# Altium schematic symbol library TI Power Management Shunt Voltage Reference.SchLib: 1526 symbols (part 6 of 18) (continued)
## LM4041DIDBZR
designator U?
Adjustable Precision Micropower Shunt Voltage Reference, 1.0% accuracy, 15 ppm / degC, 12 mA, -40 to 85 degC, 3-pin SOT-23 (DBZ), Green (RoHS & no Sb/Br); Manufacturer: Texas Instruments; PartNumber: LM4041DIDBZR; Initial Accuracy @ 25/deg C(%): 1; Iout/Iz(Max)(mA): 12; Min Iz for Regulation(uA): 65; Rating: Catalog; Temp Coeff(Max)(ppm/ degree C): 150; Temp Coeff(Typ)(ppm/ degree C): 15; VO Adj(Max)(V): 10; VO Adj(Min)(V): 1.225; DatasheetVersion: SLCS146E; PackageVersion: 4203227/B; PackageReference: DBZ3; PackageDescription: 3-Pin Plastic Small Outline, Body 2.92 x 1.3 mm, Pitch 0.95 mm; Supplier 1: Digi-Key; Supplier Part Number 1: 296-17946-2-ND; Supplier 2: Digi-Key; Supplier Part Number 2: 296-17946-1-ND; Supplier 3: Digi-Key; Supplier Part Number 3: 296-17946-6-ND; Supplier 4: Newark; Supplier Part Number 4: 31K7146; Supplier 5: Mouser; Supplier Part Number 5: 595-LM4041DIDBZR; Eco-Plan: Green (RoHS & no Sb/Br); SubFamily: Shunt Voltage Reference; Mounting Technology: Surface Mount; Code_JEDEC: TO-236; ComponentLink1Description: Manufacturer URL; ComponentLink1URL: http://www.ti.com/; ComponentLink2Description: Datasheet; ComponentLink2URL: http://www.ti.com/general/docs/lit/getliterature.tsp?genericPartNumber=LM4041D&fileType=pdf; ComponentLink3Description: Package Specification; ComponentLink3URL: http://www.ti.com/litv/pdf/mpds108a
footprint TI-DBZ3_N (SOT23, 3-Leads, Body 2.92x1.3 mm, Pitch 0.95 mm, IPC Medium Density)
pins: 1 FB (in), 2 CATHODE, 3 ANODE

## LM4041DIDBZRG4
designator U?
Adjustable Precision Micropower Shunt Voltage Reference, 1.0% accuracy, 15 ppm / degC, 12 mA, -40 to 85 degC, 3-pin SOT-23 (DBZ), Green (RoHS & no Sb/Br); Manufacturer: Texas Instruments; PartNumber: LM4041DIDBZRG4; Initial Accuracy @ 25/deg C(%): 1; Iout/Iz(Max)(mA): 12; Min Iz for Regulation(uA): 65; Rating: Catalog; Temp Coeff(Max)(ppm/ degree C): 150; Temp Coeff(Typ)(ppm/ degree C): 15; VO Adj(Max)(V): 10; VO Adj(Min)(V): 1.225; DatasheetVersion: SLCS146E; PackageVersion: 4203227/B; PackageReference: DBZ3; PackageDescription: 3-Pin Plastic Small Outline, Body 2.92 x 1.3 mm, Pitch 0.95 mm; Supplier 1: Digi-Key; Supplier Part Number 1: LM4041DIDBZRG4-ND; Supplier 2: Mouser; Supplier Part Number 2: 595-LM4041DIDBZRG4; Eco-Plan: Green (RoHS & no Sb/Br); SubFamily: Shunt Voltage Reference; Mounting Technology: Surface Mount; Code_JEDEC: TO-236; ComponentLink1Description: Manufacturer URL; ComponentLink1URL: http://www.ti.com/; ComponentLink2Description: Datasheet; ComponentLink2URL: http://www.ti.com/general/docs/lit/getliterature.tsp?genericPartNumber=LM4041D&fileType=pdf; ComponentLink3Description: Package Specification; ComponentLink3URL: http://www.ti.com/litv/pdf/mpds108a; ComponentLink4Description: URL Link1; ComponentLink4URL: Samples URL:http://www.ti.com/product/lm4041d
footprint TI-DBZ3_N (SOT23, 3-Leads, Body 2.92x1.3 mm, Pitch 0.95 mm, IPC Medium Density)
pins: 1 FB (in), 2 CATHODE, 3 ANODE

## LM4041DIDBZT
designator U?
Adjustable Precision Micropower Shunt Voltage Reference, 1.0% accuracy, 1.225 V, 15 ppm / degC, 12 mA, -40 to 85 degC, 3-pin SOT-23 (DBZ), Green (RoHS & no Sb/Br); Manufacturer: Texas Instruments; PartNumber: LM4041DIDBZT; Initial Accuracy @ 25/deg C(%): 1; Iout/Iz(Max)(mA): 12; Min Iz for Regulation(uA): 65; Rating: Catalog; Temp Coeff(Max)(ppm/ degree C): 150; Temp Coeff(Typ)(ppm/ degree C): 15; VO Adj(Max)(V): 10; VO Adj(Min)(V): 1.225; DatasheetVersion: SLCS146E; PackageVersion: 4203227/B; PackageReference: DBZ3; PackageDescription: 3-Pin Plastic Small Outline, Body 2.92 x 1.3 mm, Pitch 0.95 mm; Supplier 1: Digi-Key; Supplier Part Number 1: 296-32132-2-ND; Supplier 2: Digi-Key; Supplier Part Number 2: 296-32132-1-ND; Supplier 3: Digi-Key; Supplier Part Number 3: 296-32132-6-ND; Supplier 4: Mouser; Supplier Part Number 4: 595-LM4041DIDBZT; Eco-Plan: Green (RoHS & no Sb/Br); SubFamily: Shunt Voltage Reference; VO(V): 1.225; Mounting Technology: Surface Mount; Code_JEDEC: TO-236; ComponentLink1Description: Manufacturer URL; ComponentLink1URL: http://www.ti.com/; ComponentLink2Description: Datasheet; ComponentLink2URL: http://www.ti.com/general/docs/lit/getliterature.tsp?genericPartNumber=LM4041D&fileType=pdf; ComponentLink3Description: Package Specification; ComponentLink3URL: http://www.ti.com/litv/pdf/mpds108a
footprint TI-DBZ3_N (SOT23, 3-Leads, Body 2.92x1.3 mm, Pitch 0.95 mm, IPC Medium Density)
pins: 1 FB (in), 2 CATHODE, 3 ANODE

## LM4041DIDBZTG4
designator U?
Adjustable Precision Micropower Shunt Voltage Reference, 1.0% accuracy, 1.225 V, 15 ppm / degC, 12 mA, -40 to 85 degC, 3-pin SOT-23 (DBZ), Green (RoHS & no Sb/Br); Manufacturer: Texas Instruments; PartNumber: LM4041DIDBZTG4; Initial Accuracy @ 25/deg C(%): 1; Iout/Iz(Max)(mA): 12; Min Iz for Regulation(uA): 65; Rating: Catalog; Temp Coeff(Max)(ppm/ degree C): 150; Temp Coeff(Typ)(ppm/ degree C): 15; VO Adj(Max)(V): 10; VO Adj(Min)(V): 1.225; DatasheetVersion: SLCS146E; PackageVersion: 4203227/B; PackageReference: DBZ3; PackageDescription: 3-Pin Plastic Small Outline, Body 2.92 x 1.3 mm, Pitch 0.95 mm; Supplier 1: Digi-Key; Supplier Part Number 1: LM4041DIDBZTG4-ND; Supplier 2: Farnell; Supplier Part Number 2: 1053788; Supplier 3: Newark; Supplier Part Number 3: 97K3503; Supplier 4: Mouser; Supplier Part Number 4: 595-LM4041DIDBZTG4; Eco-Plan: Green (RoHS & no Sb/Br); SubFamily: Shunt Voltage Reference; VO(V): 1.225; Mounting Technology: Surface Mount; Code_JEDEC: TO-236; ComponentLink1Description: Manufacturer URL; ComponentLink1URL: http://www.ti.com/; ComponentLink2Description: Datasheet; ComponentLink2URL: http://www.ti.com/general/docs/lit/getliterature.tsp?genericPartNumber=LM4041D&fileType=pdf; ComponentLink3Description: Package Specification; ComponentLink3URL: http://www.ti.com/litv/pdf/mpds108a
footprint TI-DBZ3_N (SOT23, 3-Leads, Body 2.92x1.3 mm, Pitch 0.95 mm, IPC Medium Density)
pins: 1 FB (in), 2 CATHODE, 3 ANODE

## LM4041DIDCKR
designator U?
Adjustable Precision Micropower Shunt Voltage Reference, 1.0% accuracy, 15 ppm / degC, 12 mA, -40 to 85 degC, 5-pin SC70 (DCK), Green (RoHS & no Sb/Br); Manufacturer: Texas Instruments; PartNumber: LM4041DIDCKR; Initial Accuracy @ 25/deg C(%): 1; Iout/Iz(Max)(mA): 12; Min Iz for Regulation(uA): 65; Rating: Catalog; Temp Coeff(Max)(ppm/ degree C): 150; Temp Coeff(Typ)(ppm/ degree C): 15; VO Adj(Max)(V): 10; VO Adj(Min)(V): 1.225; DatasheetVersion: SLCS146E; PackageReference: DCK5; PackageDescription: 5-Pin Plastic Small-Outline Package, 2 x 1.3 mm Body, 0.65 mm Pitch, 2.1 mm Lead Span; Supplier 1: Digi-Key; Supplier Part Number 1: 296-17947-2-ND; Supplier 2: Digi-Key; Supplier Part Number 2: 296-17947-1-ND; Supplier 3: Digi-Key; Supplier Part Number 3: 296-17947-6-ND; Supplier 4: Newark; Supplier Part Number 4: 31K7150; Supplier 5: Mouser; Supplier Part Number 5: 595-LM4041DIDCKR; Eco-Plan: Green (RoHS & no Sb/Br); SubFamily: Shunt Voltage Reference; Mounting Technology: Surface Mount; Code_JEDEC: MO-203; ComponentLink1Description: Manufacturer URL; ComponentLink1URL: http://www.ti.com/; ComponentLink2Description: Datasheet; ComponentLink2URL: http://www.ti.com/general/docs/lit/getliterature.tsp?genericPartNumber=LM4041D&fileType=pdf; ComponentLink3Description: Package Specification; ComponentLink3URL: http://www.ti.com/litv/pdf/mpds025f; ComponentLink4Description: URL Link1; ComponentLink4URL: Samples URL:http://www.ti.com/product/lm4041d
footprint TI-DCK5_N (SOT353, 5-Leads, Body 2x1.3mm, Pitch 0.65mm, Lead Span 2.1mm, IPC Medium Density)
part A pins: 2 ANODE, 3 CATHODE, 5 FB (in)
part B pins: 1 NC "No internal connection.", 4 NC "No internal connection."

## LM4041DIDCKRE4
designator U?
Adjustable Precision Micropower Shunt Voltage Reference, 1.0% accuracy, 15 ppm / degC, 12 mA, -40 to 85 degC, 5-pin SC70 (DCK), Green (RoHS & no Sb/Br); Manufacturer: Texas Instruments; PartNumber: LM4041DIDCKRE4; Initial Accuracy @ 25/deg C(%): 1; Iout/Iz(Max)(mA): 12; Min Iz for Regulation(uA): 65; Rating: Catalog; Temp Coeff(Max)(ppm/ degree C): 150; Temp Coeff(Typ)(ppm/ degree C): 15; VO Adj(Max)(V): 10; VO Adj(Min)(V): 1.225; DatasheetVersion: SLCS146E; PackageReference: DCK5; PackageDescription: 5-Pin Plastic Small-Outline Package, 2 x 1.3 mm Body, 0.65 mm Pitch, 2.1 mm Lead Span; Supplier 1: Digi-Key; Supplier Part Number 1: LM4041DIDCKRE4-ND; Supplier 2: Newark; Supplier Part Number 2: 37K0375; Supplier 3: Mouser; Supplier Part Number 3: 595-LM4041DIDCKRE4; Eco-Plan: Green (RoHS & no Sb/Br); SubFamily: Shunt Voltage Reference; Mounting Technology: Surface Mount; Code_JEDEC: MO-203; ComponentLink1Description: Manufacturer URL; ComponentLink1URL: http://www.ti.com/; ComponentLink2Description: Datasheet; ComponentLink2URL: http://www.ti.com/general/docs/lit/getliterature.tsp?genericPartNumber=LM4041D&fileType=pdf; ComponentLink3Description: Package Specification; ComponentLink3URL: http://www.ti.com/litv/pdf/mpds025f; ComponentLink4Description: URL Link1; ComponentLink4URL: Samples URL:http://www.ti.com/product/lm4041d
footprint TI-DCK5_N (SOT353, 5-Leads, Body 2x1.3mm, Pitch 0.65mm, Lead Span 2.1mm, IPC Medium Density)
part A pins: 2 ANODE, 3 CATHODE, 5 FB (in)
part B pins: 1 NC "No internal connection.", 4 NC "No internal connection."

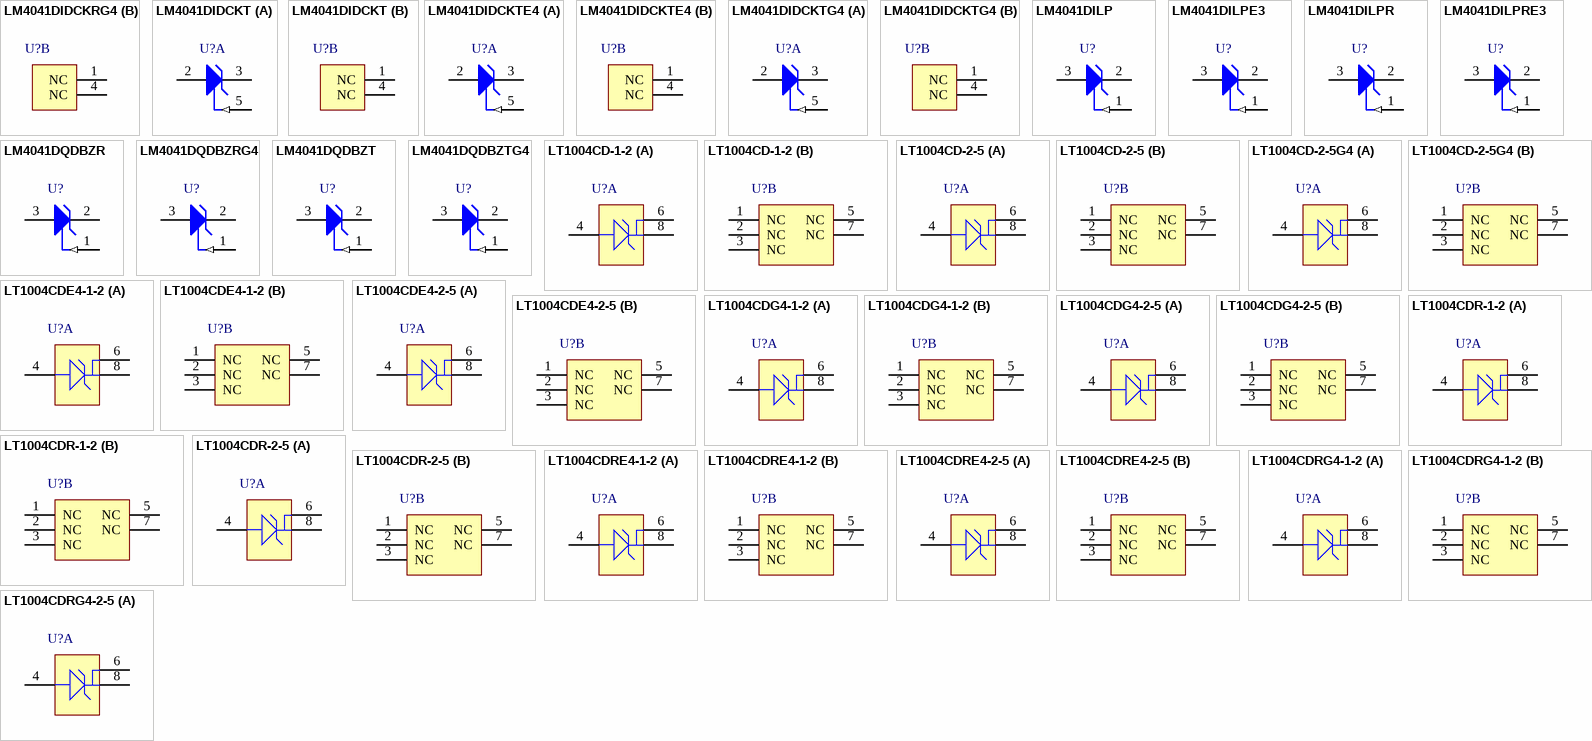
[diagram p17: symbols LM4041DIDCKRG4 to LT1004CDRG4-2-5]

## LM4041DIDCKRG4
designator U?
Adjustable Precision Micropower Shunt Voltage Reference, 1.0% accuracy, 15 ppm / degC, 12 mA, -40 to 85 degC, 5-pin SC70 (DCK), Green (RoHS & no Sb/Br); Manufacturer: Texas Instruments; PartNumber: LM4041DIDCKRG4; Initial Accuracy @ 25/deg C(%): 1; Iout/Iz(Max)(mA): 12; Min Iz for Regulation(uA): 65; Rating: Catalog; Temp Coeff(Max)(ppm/ degree C): 150; Temp Coeff(Typ)(ppm/ degree C): 15; VO Adj(Max)(V): 10; VO Adj(Min)(V): 1.225; DatasheetVersion: SLCS146E; PackageReference: DCK5; PackageDescription: 5-Pin Plastic Small-Outline Package, 2 x 1.3 mm Body, 0.65 mm Pitch, 2.1 mm Lead Span; Supplier 1: Digi-Key; Supplier Part Number 1: LM4041DIDCKRG4-ND; Supplier 2: Mouser; Supplier Part Number 2: 595-LM4041DIDCKRG4; Eco-Plan: Green (RoHS & no Sb/Br); SubFamily: Shunt Voltage Reference; Mounting Technology: Surface Mount; Code_JEDEC: MO-203; ComponentLink1Description: Manufacturer URL; ComponentLink1URL: http://www.ti.com/; ComponentLink2Description: Datasheet; ComponentLink2URL: http://www.ti.com/general/docs/lit/getliterature.tsp?genericPartNumber=LM4041D&fileType=pdf; ComponentLink3Description: Package Specification; ComponentLink3URL: http://www.ti.com/litv/pdf/mpds025f; ComponentLink4Description: URL Link1; ComponentLink4URL: Samples URL:http://www.ti.com/product/lm4041d
footprint TI-DCK5_N (SOT353, 5-Leads, Body 2x1.3mm, Pitch 0.65mm, Lead Span 2.1mm, IPC Medium Density)
part A pins: 2 ANODE, 3 CATHODE, 5 FB (in)
part B pins: 1 NC "No internal connection.", 4 NC "No internal connection."

## LM4041DIDCKT
designator U?
Adjustable Precision Micropower Shunt Voltage Reference, 1.0% accuracy, 15 ppm / degC, 12 mA, -40 to 85 degC, 5-pin SC70 (DCK), Green (RoHS & no Sb/Br); Manufacturer: Texas Instruments; PartNumber: LM4041DIDCKT; Initial Accuracy @ 25/deg C(%): 1; Iout/Iz(Max)(mA): 12; Min Iz for Regulation(uA): 65; Rating: Catalog; Temp Coeff(Max)(ppm/ degree C): 150; Temp Coeff(Typ)(ppm/ degree C): 15; VO Adj(Max)(V): 10; VO Adj(Min)(V): 1.225; DatasheetVersion: SLCS146E; PackageReference: DCK5; PackageDescription: 5-Pin Plastic Small-Outline Package, 2 x 1.3 mm Body, 0.65 mm Pitch, 2.1 mm Lead Span; Supplier 1: Digi-Key; Supplier Part Number 1: 296-32133-2-ND; Supplier 2: Digi-Key; Supplier Part Number 2: 296-32133-1-ND; Supplier 3: Digi-Key; Supplier Part Number 3: 296-32133-6-ND; Supplier 4: Mouser; Supplier Part Number 4: 595-LM4041DIDCKT; Eco-Plan: Green (RoHS & no Sb/Br); SubFamily: Shunt Voltage Reference; Mounting Technology: Surface Mount; Code_JEDEC: MO-203; ComponentLink1Description: Manufacturer URL; ComponentLink1URL: http://www.ti.com/; ComponentLink2Description: Datasheet; ComponentLink2URL: http://www.ti.com/general/docs/lit/getliterature.tsp?genericPartNumber=LM4041D&fileType=pdf; ComponentLink3Description: Package Specification; ComponentLink3URL: http://www.ti.com/litv/pdf/mpds025f
footprint TI-DCK5_N (SOT353, 5-Leads, Body 2x1.3mm, Pitch 0.65mm, Lead Span 2.1mm, IPC Medium Density)
part A pins: 2 ANODE, 3 CATHODE, 5 FB (in)
part B pins: 1 NC "No internal connection.", 4 NC "No internal connection."

## LM4041DIDCKTE4
designator U?
Adjustable Precision Micropower Shunt Voltage Reference, 1.0% accuracy, 15 ppm / degC, 12 mA, -40 to 85 degC, 5-pin SC70 (DCK), Green (RoHS & no Sb/Br); Manufacturer: Texas Instruments; PartNumber: LM4041DIDCKTE4; Initial Accuracy @ 25/deg C(%): 1; Iout/Iz(Max)(mA): 12; Min Iz for Regulation(uA): 65; Rating: Catalog; Temp Coeff(Max)(ppm/ degree C): 150; Temp Coeff(Typ)(ppm/ degree C): 15; VO Adj(Max)(V): 10; VO Adj(Min)(V): 1.225; DatasheetVersion: SLCS146E; PackageReference: DCK5; PackageDescription: 5-Pin Plastic Small-Outline Package, 2 x 1.3 mm Body, 0.65 mm Pitch, 2.1 mm Lead Span; Supplier 1: Digi-Key; Supplier Part Number 1: LM4041DIDCKTE4-ND; Supplier 2: Farnell; Supplier Part Number 2: 1053783; Supplier 3: Newark; Supplier Part Number 3: 37K0376; Supplier 4: Mouser; Supplier Part Number 4: 595-LM4041DIDCKTE4; Eco-Plan: Green (RoHS & no Sb/Br); SubFamily: Shunt Voltage Reference; Mounting Technology: Surface Mount; Code_JEDEC: MO-203; ComponentLink1Description: Manufacturer URL; ComponentLink1URL: http://www.ti.com/; ComponentLink2Description: Datasheet; ComponentLink2URL: http://www.ti.com/general/docs/lit/getliterature.tsp?genericPartNumber=LM4041D&fileType=pdf; ComponentLink3Description: Package Specification; ComponentLink3URL: http://www.ti.com/litv/pdf/mpds025f; ComponentLink4Description: URL Link1; ComponentLink4URL: Samples URL:http://www.ti.com/product/lm4041d
footprint TI-DCK5_N (SOT353, 5-Leads, Body 2x1.3mm, Pitch 0.65mm, Lead Span 2.1mm, IPC Medium Density)
part A pins: 2 ANODE, 3 CATHODE, 5 FB (in)
part B pins: 1 NC "No internal connection.", 4 NC "No internal connection."

## LM4041DIDCKTG4
designator U?
Adjustable Precision Micropower Shunt Voltage Reference, 1.0% accuracy, 15 ppm / degC, 12 mA, -40 to 85 degC, 5-pin SC70 (DCK), Green (RoHS & no Sb/Br); Manufacturer: Texas Instruments; PartNumber: LM4041DIDCKTG4; Initial Accuracy @ 25/deg C(%): 1; Iout/Iz(Max)(mA): 12; Min Iz for Regulation(uA): 65; Rating: Catalog; Temp Coeff(Max)(ppm/ degree C): 150; Temp Coeff(Typ)(ppm/ degree C): 15; VO Adj(Max)(V): 10; VO Adj(Min)(V): 1.225; DatasheetVersion: SLCS146E; PackageReference: DCK5; PackageDescription: 5-Pin Plastic Small-Outline Package, 2 x 1.3 mm Body, 0.65 mm Pitch, 2.1 mm Lead Span; Supplier 1: Digi-Key; Supplier Part Number 1: LM4041DIDCKTG4-ND; Supplier 2: Mouser; Supplier Part Number 2: 595-LM4041DIDCKTG4; Eco-Plan: Green (RoHS & no Sb/Br); SubFamily: Shunt Voltage Reference; Mounting Technology: Surface Mount; Code_JEDEC: MO-203; ComponentLink1Description: Manufacturer URL; ComponentLink1URL: http://www.ti.com/; ComponentLink2Description: Datasheet; ComponentLink2URL: http://www.ti.com/general/docs/lit/getliterature.tsp?genericPartNumber=LM4041D&fileType=pdf; ComponentLink3Description: Package Specification; ComponentLink3URL: http://www.ti.com/litv/pdf/mpds025f; ComponentLink4Description: URL Link1; ComponentLink4URL: Samples URL:http://www.ti.com/product/lm4041d
footprint TI-DCK5_N (SOT353, 5-Leads, Body 2x1.3mm, Pitch 0.65mm, Lead Span 2.1mm, IPC Medium Density)
part A pins: 2 ANODE, 3 CATHODE, 5 FB (in)
part B pins: 1 NC "No internal connection.", 4 NC "No internal connection."

## LM4041DILP
designator U?
Adjustable Precision Micropower Shunt Voltage Reference, 1.0% accuracy, 15 ppm / degC, 12 mA, -40 to 85 degC, 3-pin TO-92 (LP), Pb-Free (RoHS); Manufacturer: Texas Instruments; PartNumber: LM4041DILP; Initial Accuracy @ 25/deg C(%): 1; Iout/Iz(Max)(mA): 12; Min Iz for Regulation(uA): 65; Rating: Catalog; Temp Coeff(Max)(ppm/ degree C): 150; Temp Coeff(Typ)(ppm/ degree C): 15; VO Adj(Max)(V): 10; VO Adj(Min)(V): 1.225; DatasheetVersion: SLCS146E; PackageVersion: 4040001-2/C; PackageReference: LP3; PackageDescription: Plastic Cylindrical Package, Formed Lead Option (TO-92); Supplier 1: Digi-Key; Supplier Part Number 1: LM4041DILP-ND; Supplier 2: Newark; Supplier Part Number 2: 50M8858; Supplier 3: Mouser; Supplier Part Number 3: 595-LM4041DILP; Eco-Plan: Pb-Free (RoHS); SubFamily: Shunt Voltage Reference; Mounting Technology: Through Hole; Code_JEDEC: TO-226; ComponentLink1Description: Manufacturer URL; ComponentLink1URL: http://www.ti.com/; ComponentLink2Description: Datasheet; ComponentLink2URL: http://www.ti.com/general/docs/lit/getliterature.tsp?genericPartNumber=LM4041D&fileType=pdf; ComponentLink3Description: Package Specification; ComponentLink3URL: http://www.ti.com/litv/pdf/msot002a; ComponentLink4Description: URL Link1; ComponentLink4URL: Samples URL:http://www.ti.com/product/lm4041d
footprint TI-LP3 (TO, Flat Index; 3 In-Line, Formed Axial Leads; Body Dia. 4.8mm; Leads 0.56 x 0.41 mm (max))
pins: 1 FB (in), 2 CATHODE, 3 ANODE

## LM4041DILPE3
designator U?
Adjustable Precision Micropower Shunt Voltage Reference, 1.0% accuracy, 15 ppm / degC, 12 mA, -40 to 85 degC, 3-pin TO-92 (LP), Pb-Free (RoHS); Manufacturer: Texas Instruments; PartNumber: LM4041DILPE3; Initial Accuracy @ 25/deg C(%): 1; Iout/Iz(Max)(mA): 12; Min Iz for Regulation(uA): 65; Rating: Catalog; Temp Coeff(Max)(ppm/ degree C): 150; Temp Coeff(Typ)(ppm/ degree C): 15; VO Adj(Max)(V): 10; VO Adj(Min)(V): 1.225; DatasheetVersion: SLCS146E; PackageVersion: 4040001-2/C; PackageReference: LP3; PackageDescription: Plastic Cylindrical Package, Formed Lead Option (TO-92); Supplier 1: Digi-Key; Supplier Part Number 1: LM4041DILPE3-ND; Supplier 2: Newark; Supplier Part Number 2: 65M1450; Supplier 3: Mouser; Supplier Part Number 3: 595-LM4041DILPE3; Eco-Plan: Pb-Free (RoHS); SubFamily: Shunt Voltage Reference; Mounting Technology: Through Hole; Code_JEDEC: TO-226; ComponentLink1Description: Manufacturer URL; ComponentLink1URL: http://www.ti.com/; ComponentLink2Description: Datasheet; ComponentLink2URL: http://www.ti.com/general/docs/lit/getliterature.tsp?genericPartNumber=LM4041D&fileType=pdf; ComponentLink3Description: Package Specification; ComponentLink3URL: http://www.ti.com/litv/pdf/msot002a
footprint TI-LP3 (TO, Flat Index; 3 In-Line, Formed Axial Leads; Body Dia. 4.8mm; Leads 0.56 x 0.41 mm (max))
pins: 1 FB (in), 2 CATHODE, 3 ANODE

## LM4041DILPR
designator U?
Adjustable Precision Micropower Shunt Voltage Reference, 1.0% accuracy, 15 ppm / degC, 12 mA, -40 to 85 degC, 3-pin TO-92 (LP), Pb-Free (RoHS); Manufacturer: Texas Instruments; PartNumber: LM4041DILPR; Initial Accuracy @ 25/deg C(%): 1; Iout/Iz(Max)(mA): 12; Min Iz for Regulation(uA): 65; Rating: Catalog; Temp Coeff(Max)(ppm/ degree C): 150; Temp Coeff(Typ)(ppm/ degree C): 15; VO Adj(Max)(V): 10; VO Adj(Min)(V): 1.225; DatasheetVersion: SLCS146E; PackageVersion: 4040001-2/C; PackageReference: LP3; PackageDescription: Plastic Cylindrical Package, Formed Lead Option (TO-92); Supplier 1: Digi-Key; Supplier Part Number 1: 296-22176-3-ND; Supplier 2: Digi-Key; Supplier Part Number 2: 296-22176-1-ND; Supplier 3: Newark; Supplier Part Number 3: 50M8859; Supplier 4: Mouser; Supplier Part Number 4: 595-LM4041DILPR; Eco-Plan: Pb-Free (RoHS); SubFamily: Shunt Voltage Reference; Mounting Technology: Through Hole; Code_JEDEC: TO-226; ComponentLink1Description: Manufacturer URL; ComponentLink1URL: http://www.ti.com/; ComponentLink2Description: Datasheet; ComponentLink2URL: http://www.ti.com/general/docs/lit/getliterature.tsp?genericPartNumber=LM4041D&fileType=pdf; ComponentLink3Description: Package Specification; ComponentLink3URL: http://www.ti.com/litv/pdf/msot002a
footprint TI-LP3 (TO, Flat Index; 3 In-Line, Formed Axial Leads; Body Dia. 4.8mm; Leads 0.56 x 0.41 mm (max))
pins: 1 FB (in), 2 CATHODE, 3 ANODE

## LM4041DILPRE3
designator U?
Adjustable Precision Micropower Shunt Voltage Reference, 1.0% accuracy, 15 ppm / degC, 12 mA, -40 to 85 degC, 3-pin TO-92 (LP), Pb-Free (RoHS); Manufacturer: Texas Instruments; PartNumber: LM4041DILPRE3; Initial Accuracy @ 25/deg C(%): 1; Iout/Iz(Max)(mA): 12; Min Iz for Regulation(uA): 65; Rating: Catalog; Temp Coeff(Max)(ppm/ degree C): 150; Temp Coeff(Typ)(ppm/ degree C): 15; VO Adj(Max)(V): 10; VO Adj(Min)(V): 1.225; DatasheetVersion: SLCS146E; PackageVersion: 4040001-2/C; PackageReference: LP3; PackageDescription: Plastic Cylindrical Package, Formed Lead Option (TO-92); Supplier 1: Digi-Key; Supplier Part Number 1: LM4041DILPRE3-ND; Supplier 2: Mouser; Supplier Part Number 2: 595-LM4041DILPRE3; Eco-Plan: Pb-Free (RoHS); SubFamily: Shunt Voltage Reference; Mounting Technology: Through Hole; Code_JEDEC: TO-226; ComponentLink1Description: Manufacturer URL; ComponentLink1URL: http://www.ti.com/; ComponentLink2Description: Datasheet; ComponentLink2URL: http://www.ti.com/general/docs/lit/getliterature.tsp?genericPartNumber=LM4041D&fileType=pdf; ComponentLink3Description: Package Specification; ComponentLink3URL: http://www.ti.com/litv/pdf/msot002a
footprint TI-LP3 (TO, Flat Index; 3 In-Line, Formed Axial Leads; Body Dia. 4.8mm; Leads 0.56 x 0.41 mm (max))
pins: 1 FB (in), 2 CATHODE, 3 ANODE

## LM4041DQDBZR
designator U?
Adjustable Precision Micropower Shunt Voltage Reference, 1.0% accuracy, 15 ppm / degC, 12 mA, -40 to 125 degC, 3-pin SOT-23 (DBZ), Green (RoHS & no Sb/Br); Manufacturer: Texas Instruments; PartNumber: LM4041DQDBZR; Initial Accuracy @ 25/deg C(%): 1; Iout/Iz(Max)(mA): 12; Min Iz for Regulation(uA): 65; Rating: Catalog; Temp Coeff(Max)(ppm/ degree C): 150; Temp Coeff(Typ)(ppm/ degree C): 15; VO Adj(Max)(V): 10; VO Adj(Min)(V): 1.225; DatasheetVersion: SLCS146E; PackageVersion: 4203227/B; PackageReference: DBZ3; PackageDescription: 3-Pin Plastic Small Outline, Body 2.92 x 1.3 mm, Pitch 0.95 mm; Supplier 1: Digi-Key; Supplier Part Number 1: 296-17948-2-ND; Supplier 2: Digi-Key; Supplier Part Number 2: 296-17948-1-ND; Supplier 3: Digi-Key; Supplier Part Number 3: 296-17948-6-ND; Supplier 4: Mouser; Supplier Part Number 4: 595-LM4041DQDBZR; Eco-Plan: Green (RoHS & no Sb/Br); SubFamily: Shunt Voltage Reference; Mounting Technology: Surface Mount; Code_JEDEC: TO-236; ComponentLink1Description: Manufacturer URL; ComponentLink1URL: http://www.ti.com/; ComponentLink2Description: Datasheet; ComponentLink2URL: http://www.ti.com/general/docs/lit/getliterature.tsp?genericPartNumber=LM4041D&fileType=pdf; ComponentLink3Description: Package Specification; ComponentLink3URL: http://www.ti.com/litv/pdf/mpds108a; ComponentLink4Description: URL Link1; ComponentLink4URL: Samples URL:http://www.ti.com/product/lm4041d
footprint TI-DBZ3_N (SOT23, 3-Leads, Body 2.92x1.3 mm, Pitch 0.95 mm, IPC Medium Density)
pins: 1 FB (in), 2 CATHODE, 3 ANODE

## LM4041DQDBZRG4
designator U?
Adjustable Precision Micropower Shunt Voltage Reference, 1.0% accuracy, 15 ppm / degC, 12 mA, -40 to 125 degC, 3-pin SOT-23 (DBZ), Green (RoHS & no Sb/Br); Manufacturer: Texas Instruments; PartNumber: LM4041DQDBZRG4; Initial Accuracy @ 25/deg C(%): 1; Iout/Iz(Max)(mA): 12; Min Iz for Regulation(uA): 65; Rating: Catalog; Temp Coeff(Max)(ppm/ degree C): 150; Temp Coeff(Typ)(ppm/ degree C): 15; VO Adj(Max)(V): 10; VO Adj(Min)(V): 1.225; DatasheetVersion: SLCS146E; PackageVersion: 4203227/B; PackageReference: DBZ3; PackageDescription: 3-Pin Plastic Small Outline, Body 2.92 x 1.3 mm, Pitch 0.95 mm; Supplier 1: Digi-Key; Supplier Part Number 1: LM4041DQDBZRG4-ND; Supplier 2: Newark; Supplier Part Number 2: 31K7153; Supplier 3: Mouser; Supplier Part Number 3: 595-LM4041DQDBZRG4; Eco-Plan: Green (RoHS & no Sb/Br); SubFamily: Shunt Voltage Reference; Mounting Technology: Surface Mount; Code_JEDEC: TO-236; ComponentLink1Description: Manufacturer URL; ComponentLink1URL: http://www.ti.com/; ComponentLink2Description: Datasheet; ComponentLink2URL: http://www.ti.com/general/docs/lit/getliterature.tsp?genericPartNumber=LM4041D&fileType=pdf; ComponentLink3Description: Package Specification; ComponentLink3URL: http://www.ti.com/litv/pdf/mpds108a; ComponentLink4Description: URL Link1; ComponentLink4URL: Samples URL:http://www.ti.com/product/lm4041d
footprint TI-DBZ3_N (SOT23, 3-Leads, Body 2.92x1.3 mm, Pitch 0.95 mm, IPC Medium Density)
pins: 1 FB (in), 2 CATHODE, 3 ANODE

## LM4041DQDBZT
designator U?
Adjustable Precision Micropower Shunt Voltage Reference,1.0% accuracy, 15 ppm / degC, 12 mA, -40 to 125 degC, 3-pin SOT-23 (DBZ), Green (RoHS & no Sb/Br); Manufacturer: Texas Instruments; PartNumber: LM4041DQDBZT; Initial Accuracy @ 25/deg C(%): 1; Iout/Iz(Max)(mA): 12; Min Iz for Regulation(uA): 65; Rating: Catalog; Temp Coeff(Max)(ppm/ degree C): 150; Temp Coeff(Typ)(ppm/ degree C): 15; VO Adj(Max)(V): 10; VO Adj(Min)(V): 1.225; DatasheetVersion: SLCS146E; PackageVersion: 4203227/B; PackageReference: DBZ3; PackageDescription: 3-Pin Plastic Small Outline, Body 2.92 x 1.3 mm, Pitch 0.95 mm; Supplier 1: Digi-Key; Supplier Part Number 1: 296-32134-2-ND; Supplier 2: Digi-Key; Supplier Part Number 2: 296-32134-1-ND; Supplier 3: Digi-Key; Supplier Part Number 3: 296-32134-6-ND; Supplier 4: Farnell; Supplier Part Number 4: 1053780; Supplier 5: Mouser; Supplier Part Number 5: 595-LM4041DQDBZT; Eco-Plan: Green (RoHS & no Sb/Br); SubFamily: Shunt Voltage Reference; Mounting Technology: Surface Mount; Code_JEDEC: TO-236; ComponentLink1Description: Manufacturer URL; ComponentLink1URL: http://www.ti.com/; ComponentLink2Description: Datasheet; ComponentLink2URL: http://www.ti.com/general/docs/lit/getliterature.tsp?genericPartNumber=LM4041D&fileType=pdf; ComponentLink3Description: Package Specification; ComponentLink3URL: http://www.ti.com/litv/pdf/mpds108a; ComponentLink4Description: URL Link1; ComponentLink4URL: Samples URL:http://www.ti.com/product/lm4041d
footprint TI-DBZ3_N (SOT23, 3-Leads, Body 2.92x1.3 mm, Pitch 0.95 mm, IPC Medium Density)
pins: 1 FB (in), 2 CATHODE, 3 ANODE

## LM4041DQDBZTG4
designator U?
Adjustable Precision Micropower Shunt Voltage Reference,1.0% accuracy, 15 ppm / degC, 12 mA, -40 to 125 degC, 3-pin SOT-23 (DBZ), Green (RoHS & no Sb/Br); Manufacturer: Texas Instruments; PartNumber: LM4041DQDBZTG4; Initial Accuracy @ 25/deg C(%): 1; Iout/Iz(Max)(mA): 12; Min Iz for Regulation(uA): 65; Rating: Catalog; Temp Coeff(Max)(ppm/ degree C): 150; Temp Coeff(Typ)(ppm/ degree C): 15; VO Adj(Max)(V): 10; VO Adj(Min)(V): 1.225; DatasheetVersion: SLCS146E; PackageVersion: 4203227/B; PackageReference: DBZ3; PackageDescription: 3-Pin Plastic Small Outline, Body 2.92 x 1.3 mm, Pitch 0.95 mm; Supplier 1: Digi-Key; Supplier Part Number 1: LM4041DQDBZTG4-ND; Supplier 2: Farnell; Supplier Part Number 2: 1053779; Supplier 3: Newark; Supplier Part Number 3: 97K3509; Supplier 4: Mouser; Supplier Part Number 4: 595-LM4041DQDBZTG4; Eco-Plan: Green (RoHS & no Sb/Br); SubFamily: Shunt Voltage Reference; Mounting Technology: Surface Mount; Code_JEDEC: TO-236; ComponentLink1Description: Manufacturer URL; ComponentLink1URL: http://www.ti.com/; ComponentLink2Description: Datasheet; ComponentLink2URL: http://www.ti.com/general/docs/lit/getliterature.tsp?genericPartNumber=LM4041D&fileType=pdf; ComponentLink3Description: Package Specification; ComponentLink3URL: http://www.ti.com/litv/pdf/mpds108a; ComponentLink4Description: URL Link1; ComponentLink4URL: Samples URL:http://www.ti.com/product/lm4041d
footprint TI-DBZ3_N (SOT23, 3-Leads, Body 2.92x1.3 mm, Pitch 0.95 mm, IPC Medium Density)
pins: 1 FB (in), 2 CATHODE, 3 ANODE

## LT1004CD-1-2
designator U?
Micropower Integrated Precision Voltage Reference, 1.235 V, 20 ppm / degC, 20 mA, 0 to 70 degC, 8-pin SOIC (D), Green (RoHS & no Sb/Br); Manufacturer: Texas Instruments; PartNumber: LT1004CD-1-2; Initial Accuracy @ 25/deg C(%): 1; Iout/Iz(Max)(mA): 20; Min Iz for Regulation(uA): 10; Rating: Catalog; SubFamily: Shunt Voltage Reference; VO(V): 1.235; DatasheetVersion: SLVS022M; PackageVersion: 4040047-3/M; PackageReference: D8; PackageDescription: 8-Pin Plastic Small Outline, Body 4.9 x 3.9 mm, Pitch 1.27 mm; Supplier 1: Digi-Key; Supplier Part Number 1: 296-9580-5-ND; Supplier 2: Newark; Supplier Part Number 2: 75C0910; Supplier 3: Mouser; Supplier Part Number 3: 595-LT1004CD-1-2; Eco-Plan: Green (RoHS & no Sb/Br); Temp Coeff(Typ)(ppm/ degree C): 20; Mounting Technology: Surface Mount; Code_JEDEC: MS-012; ComponentLink1Description: Manufacturer URL; ComponentLink1URL: http://www.ti.com/; ComponentLink2Description: Datasheet; ComponentLink2URL: http://www.ti.com/general/docs/lit/getliterature.tsp?genericPartNumber=LT1004-1.2&fileType=pdf; ComponentLink3Description: Package Specification; ComponentLink3URL: http://www.ti.com/litv/pdf/msoi002j
footprint TI-D8_N (SOIC, 8-Leads, Body 4.9x3.9mm, Pitch 1.27mm, IPC Medium Density)
part A pins: 4 ANODE, 6 CATHODE, 8 CATHODE
part B pins: 1 NC "No internal connection", 2 NC "No internal connection", 3 NC "No internal connection", 5 NC "No internal connection", 7 NC "No internal connection"
